# Altium footprint library Stabiliser.PcbLib: 128 footprints (part 6 of 8)
Each footprint in its own frame and in the unit in brackets; x right, y up, seen from the top. Pads: shape width x height; smd on the part's side, far side on the other; paste and mask are expansions set on the pad; w line width, h text height; cw(c..) or ccw(c..) is an arc to the next point about the centre after c.
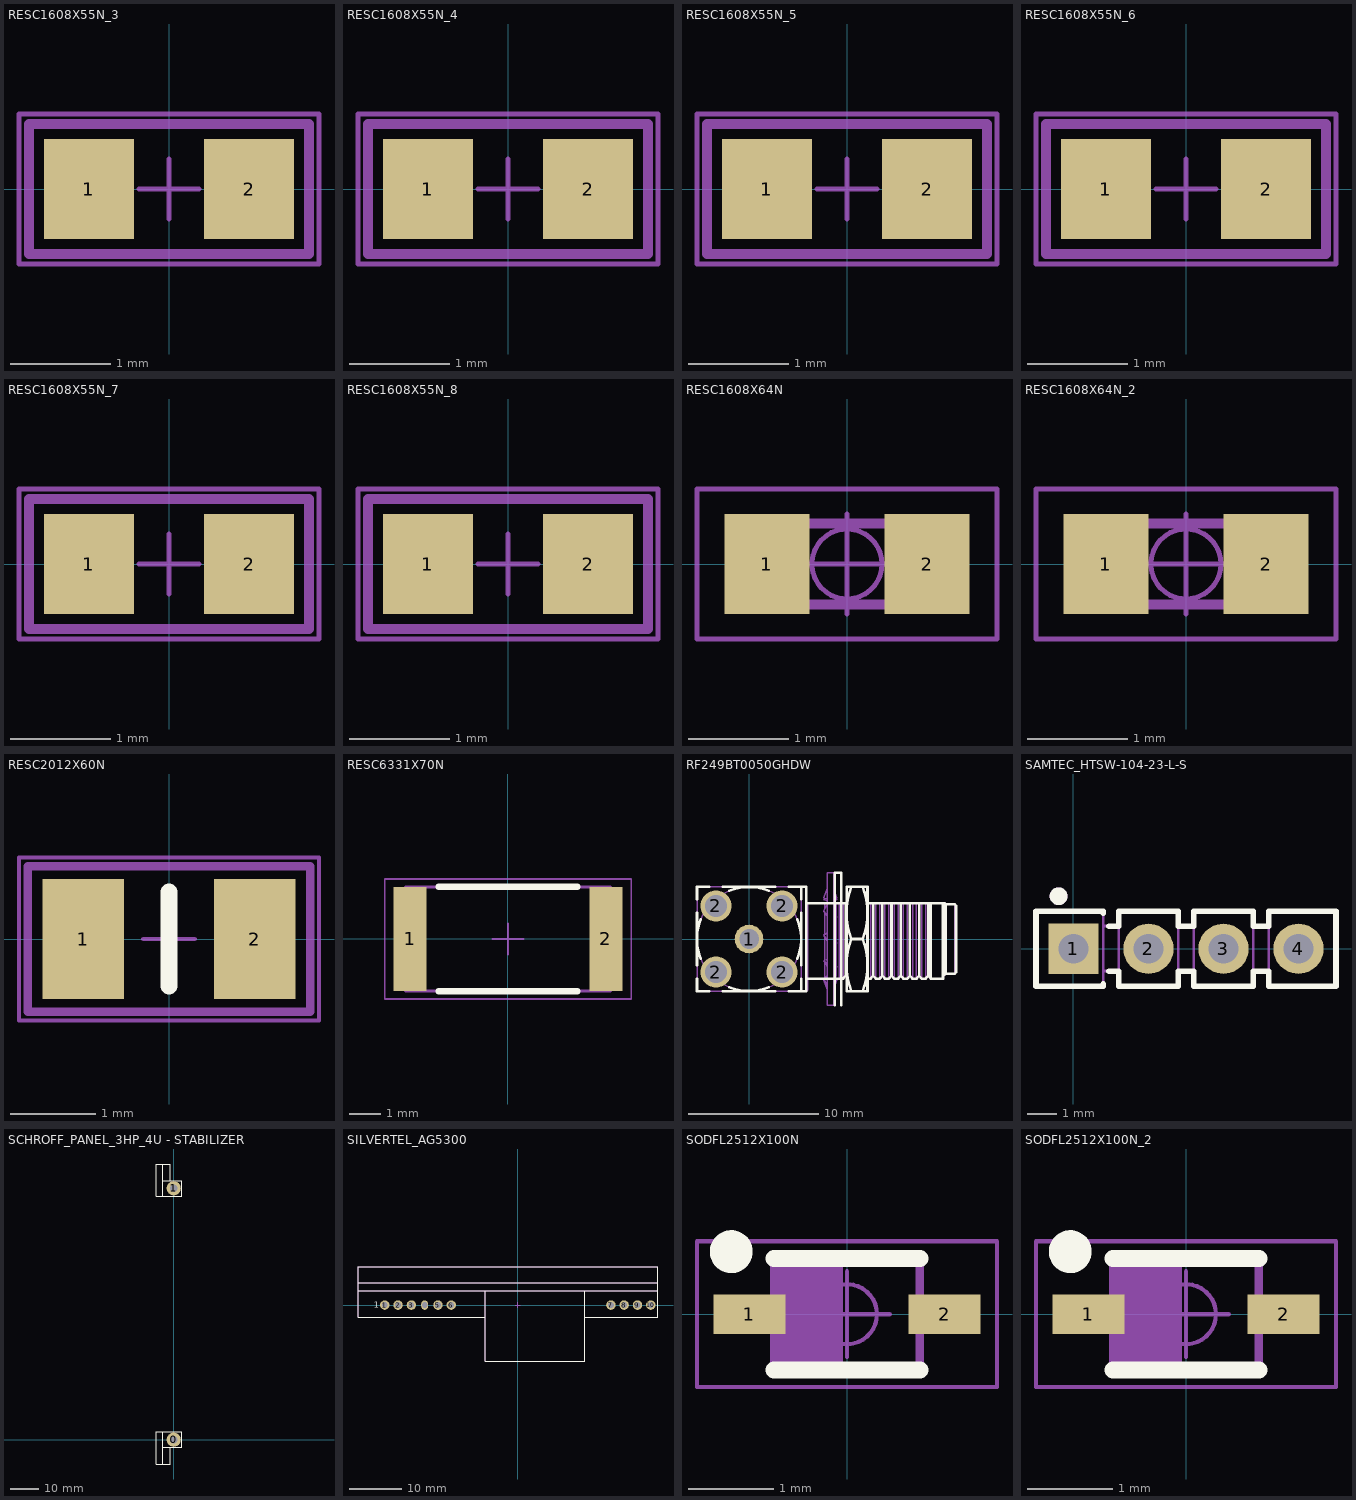
[diagram p5: the footprints below, top view; thin cyan lines are the x and y axes]

## RESC1608X55N_3 [mm]
pads (2):
  rect 0.9x1 smd: 1(-0.8,0) 2(0.8,0)
Mechanical 14:
  lines w0.1: -1.4,-0.65 -1.4,0.65 1.4,0.65 1.4,-0.65 -1.4,-0.65
Mechanical 15:
  lines w0.05: -0.3,0 0.3,0 ; 0,-0.3 0,0.3 ; -1.5,-0.75 1.5,-0.75 1.5,0.75 -1.5,0.75 -1.5,-0.75
3D body "RESC1608X55N.stp": height 0.55, standoff 0, extent -0.875,-0.475 0.875,0.475

## RESC1608X55N_4 [mm]
pads (2):
  rect 0.9x1 smd: 1(-0.8,0) 2(0.8,0)
Mechanical 14:
  lines w0.1: -1.4,-0.65 -1.4,0.65 1.4,0.65 1.4,-0.65 -1.4,-0.65
Mechanical 15:
  lines w0.05: -0.3,0 0.3,0 ; 0,-0.3 0,0.3 ; -1.5,-0.75 1.5,-0.75 1.5,0.75 -1.5,0.75 -1.5,-0.75
3D body "RESC1608X55N.stp": height 0.55, standoff 0, extent -0.875,-0.475 0.875,0.475

## RESC1608X55N_5 [mm]
pads (2):
  rect 0.9x1 smd: 1(-0.8,0) 2(0.8,0)
Mechanical 14:
  lines w0.1: -1.4,-0.65 1.4,-0.65 1.4,0.65 -1.4,0.65 -1.4,-0.65
Mechanical 15:
  lines w0.05: -0.3,0 0.3,0 ; 0,-0.3 0,0.3 ; -1.5,-0.75 -1.5,0.75 1.5,0.75 1.5,-0.75 -1.5,-0.75
3D body "RESC1608X55N.stp": height 0.55, standoff 0, extent -0.875,-0.475 0.875,0.475

## RESC1608X55N_6 [mm]
pads (2):
  rect 0.9x1 smd: 1(-0.8,0) 2(0.8,0)
Mechanical 14:
  lines w0.1: -1.4,-0.65 1.4,-0.65 1.4,0.65 -1.4,0.65 -1.4,-0.65
Mechanical 15:
  lines w0.05: -0.3,0 0.3,0 ; 0,-0.3 0,0.3 ; -1.5,-0.75 -1.5,0.75 1.5,0.75 1.5,-0.75 -1.5,-0.75
3D body "RESC1608X55N.stp": height 0.55, standoff 0, extent -0.875,-0.475 0.875,0.475

## RESC1608X55N_7 [mm]
pads (2):
  rect 0.9x1 smd: 1(-0.8,0) 2(0.8,0)
Mechanical 14:
  lines w0.1: -1.4,-0.65 1.4,-0.65 1.4,0.65 -1.4,0.65 -1.4,-0.65
Mechanical 15:
  lines w0.05: -0.3,0 0.3,0 ; 0,-0.3 0,0.3 ; -1.5,-0.75 -1.5,0.75 1.5,0.75 1.5,-0.75 -1.5,-0.75
3D body "RESC1608X55N.stp": height 0.55, standoff 0, extent -0.875,-0.475 0.875,0.475

## RESC1608X55N_8 [mm]
pads (2):
  rect 0.9x1 smd: 1(-0.8,0) 2(0.8,0)
Mechanical 14:
  lines w0.1: -1.4,-0.65 -1.4,0.65 1.4,0.65 1.4,-0.65 -1.4,-0.65
Mechanical 15:
  lines w0.05: -0.3,0 0.3,0 ; 0,-0.3 0,0.3 ; -1.5,-0.75 1.5,-0.75 1.5,0.75 -1.5,0.75 -1.5,-0.75
3D body "RESC1608X55N.stp": height 0.55, standoff 0, extent -0.875,-0.475 0.875,0.475

## RESC1608X64N [mm] "Chip Resistor, EIA 0603, Metric 1608, Body 1.6x0.8mm, IPC Medium Density"
height 0.64
pads (2):
  rect 0.85x1 smd: 1(-0.8,0) 2(0.8,0)
Mechanical 14:
  lines w0.1: -0.8,-0.405 -0.8,0.405 0.8,0.405 0.8,-0.405 -0.8,-0.405
Mechanical 15:
  circle w0.05: c0,0 r0.35
  lines w0.05: -0.5,0 0.5,0 ; 0,-0.5 0,0.5 ; -1.5,-0.75 -1.5,0.75 1.5,0.75 1.5,-0.75 -1.5,-0.75
3D body "RESC1608X64N.stp": height 0.64, standoff 0, extent -0.875,-0.475 0.875,0.475

## RESC1608X64N_2 [mm]
pads (2):
  rect 0.85x1 smd: 1(-0.8,0) 2(0.8,0)
Mechanical 14:
  lines w0.1: -0.8,-0.405 -0.8,0.405 0.8,0.405 0.8,-0.405 -0.8,-0.405
Mechanical 15:
  circle w0.05: c0,0 r0.35
  lines w0.05: -0.5,0 0.5,0 ; 0,-0.5 0,0.5 ; -1.5,-0.75 -1.5,0.75 1.5,0.75 1.5,-0.75 -1.5,-0.75
3D body "RESC1608X64N.stp": height 0.64, standoff 0, extent -0.875,-0.475 0.875,0.475

## RESC2012X60N [mm] "Chip Resistor, EIA 0805, Metric 2012, Body 2.0x1.2mm, IPC Medium Density"
height 0.6
pads (2):
  rect 0.95x1.4 smd: 1(-1,0) 2(1,0)
Top Overlay:
  lines w0.2: 0,-0.55 0,0.55
Mechanical 14:
  lines w0.1: -1.65,-0.85 1.65,-0.85 1.65,0.85 -1.65,0.85 -1.65,-0.85
Mechanical 15:
  lines w0.05: -0.3,0 0.3,0 ; 0,-0.3 0,0.3 ; -1.75,-0.95 -1.75,0.95 1.75,0.95 1.75,-0.95 -1.75,-0.95
3D body "RESC2012X60N.stp": height 0.6, standoff 0, extent -1.1,-0.675 1.1,0.675

## RESC6331X70N [mm] "Chip Resistor, EIA 2512, Metric 6331, 2-Leads, Body 6.3x3.1mm, IPC Medium Density"
height 0.7
pads (2):
  rect 1.05x3.3 smd: 1(-3.1,0) 2(3.1,0)
Top Overlay:
  lines w0.2: -2.2,-1.65 2.2,-1.65 ; -2.2,1.65 2.2,1.65
Mechanical 14:
  lines w0.1: -3.25,-1.65 3.25,-1.65 3.25,1.65 -3.25,1.65 -3.25,-1.65
Mechanical 15:
  lines w0.05: -0.5,0 0.5,0 ; 0,-0.5 0,0.5 ; -3.9,-1.9 3.9,-1.9 3.9,1.9 -3.9,1.9 -3.9,-1.9
3D body "RESC6331X70N.stp": height 0.7, standoff 0, extent -3.25,-1.65 3.25,1.65

## RF249BT0050GHDW [mm] "50 Ohm Through Hole SMA Right Angle PCB Jack"
height 10.44
pads (5):
  round 2.2 hole 1.5: 1(0,0)
  round 2.4 hole 1.7: 2(-2.54,-2.54) 2(-2.54,2.54) 2(2.54,-2.54) 2(2.54,2.54)
Top Overlay:
  lines w0.2: -4,-3.06 -4,-4 -3.06,-4 ; -4,-2.02 -4,2.02 ; -4,3.06 -4,4 -3.06,4 ; -3.702,-1.514 cw(c0,0) -3.702,1.514 ; -2.02,-4 2.02,-4 ; -2.02,4 2.02,4 ; -1.514,-3.702 ccw(c0,0) 1.514,-3.702 ; -1.514,3.702 cw(c0,0) 1.514,3.702 ; 3.06,-4 4.4,-4 4.4,2.75 ; 3.06,4 4.4,4 4.4,2.75 ; 3.702,-1.514 ccw(c0,0) 3.702,1.514 ; 4,-4 4,-3.06 ; 4,-2.02 4,2.02 ; 4,3.06 4,4 ; 4.5,-3.05 7.069,-3.05 ; 6.6,-5.1 6.6,5.1 7.1,5.1 7.1,-5.1 ; 6.917,-3.05 7.221,-3.05 7.422,-2.825 ; 7.422,2.75 7.422,-2.825 ; 7.5,-2.912 7.422,-2.825 ; 7.5,2.75 6,2.75 4.4,2.75 ; 7.857,-4 cw(c13.277,-2) 7.857,0 ; 7.857,4 ccw(c13.277,2) 7.857,0 ; 8.743,-4 ccw(c3.323,-2) 8.743,0 ; 8.743,4 cw(c3.323,2) 8.743,0 ; 9.1,-3.05 9.338,-3.05 9.539,-2.825 ; 9.1,2.75 15.021,2.75 15.1,2.675 15.1,-2.675 14.907,-2.858 ; 9.539,2.75 9.539,-2.825 ; 10.244,2.75 10.244,-2.825 ; 10.95,2.75 10.95,-2.825 ; 11.655,2.75 11.655,-2.825 ; 12.361,2.75 12.361,-2.825 ; 13.066,2.75 13.066,-2.825 ; 13.772,2.75 13.772,-2.825 ; 13.973,2.75 13.973,-3.05 ; 14.907,2.75 14.907,-3.05 13.973,-3.05 ; 15.1,-2.665 15.8,-2.665 15.9,-2.565 15.9,2.565 15.8,2.665 15.1,2.665 ; 7.857,0 8.743,0 ; 9.539,-2.825 9.739,-3.05 10.043,-3.05 10.244,-2.825 ; 10.244,-2.825 10.445,-3.05 10.749,-3.05 10.95,-2.825 ; 10.95,-2.825 11.151,-3.05 11.455,-3.05 11.655,-2.825 ; 11.655,-2.825 11.856,-3.05 12.16,-3.05 12.361,-2.825 ; 12.361,-2.825 12.562,-3.05 12.866,-3.05 13.066,-2.825 ; 13.066,-2.825 13.267,-3.05 13.571,-3.05 13.772,-2.825 ; 13.772,-2.825 13.973,-3.05 ; 7.5,-4 7.5,4 9.1,4 9.1,-4 7.5,-4
Mechanical 8:
  lines w0.05: -3.04,-2.54 -2.54,-2.54 ; -3.04,2.54 -2.54,2.54 ; -2.54,-3.04 -2.54,-2.54 ; -2.54,-2.04 -2.54,-2.54 ; -2.54,2.04 -2.54,2.54 ; -2.54,3.04 -2.54,2.54 ; -2.04,-2.54 -2.54,-2.54 ; -2.04,2.54 -2.54,2.54 ; -0.5,0 0,0 ; 0,-0.5 0,0 ; 0,0.5 0,0 ; 0.5,0 0,0 ; 2.04,-2.54 2.54,-2.54 ; 2.04,2.54 2.54,2.54 ; 2.54,-3.04 2.54,-2.54 ; 2.54,-2.04 2.54,-2.54 ; 2.54,2.04 2.54,2.54 ; 2.54,3.04 2.54,2.54 ; 3.04,-2.54 2.54,-2.54 ; 3.04,2.54 2.54,2.54
Mechanical 14:
  circle w0.1: c0,0 r4
  lines w0.1: 4,-4 4,4 ; 4.5,-3.05 5.907,-3.05 6,-2.957 ; 4.5,2.75 4.5,-3.9 4.4,-4 -4,-4 -4,4 4.4,4 4.4,2.75 6,2.75 ; 5.752,-3.001 6,-3.595 ; 5.81,-2.991 5.81,-1.747 ; 5.81,-1.649 5.81,0.189 ; 5.81,0.336 5.81,2.064 ; 5.81,2.277 5.81,2.75 ; 5.813,-3.148 5.752,-3.181 ; 5.813,3.148 5.752,3.001 ; 5.833,-3.195 5.752,-3.181 ; 5.873,-2.98 6,-2.837 ; 5.92,3.091 5.752,3.001 ; 6,-3.897 5.752,-3.181 ; 6,-2.206 ccw(c4.998,-2.351) 5.752,-1.676 ; 6,-1.92 5.752,-1.676 ; 6,-1.56 5.752,-1.676 ; 6,-0.139 5.752,0.29 6,0.488 ; 6,1.798 5.752,2.145 6,2.71 ; 6,2.957 5.752,3.001 ; 6,3.048 5.752,3.181 6,3.897 ; 6.5,-3.881 6.748,-3.181 6.5,-3.048 ; 6.5,-2.701 6.748,-2.145 6.5,-1.798 ; 6.5,-0.49 6.748,-0.29 6.5,0.139 ; 6.5,1.56 6.748,1.676 ; 6.5,1.909 6.748,1.676 ; 6.5,2.107 6.748,1.676 ; 6.5,2.75 7.5,2.75 ; 6.5,2.957 6.748,3.001 6.5,3.579 ; 6.5,3.881 6.748,3.181 ; 6.513,-3.055 6.716,-2.825 6.716,-2.215 ; 6.58,-3.091 6.748,-3.001 ; 6.586,-2.972 6.748,-3.001 ; 6.665,3.195 6.748,3.181 ; 6.685,-3.147 6.748,-3.001 ; 6.685,3.147 6.748,3.181 ; 6.716,-2.101 6.716,-0.315 ; 6.716,-0.236 6.716,1.661 ; 6.716,1.72 6.716,2.75 ; 6.917,2.75 6.917,-3.05 7.221,-3.05 ; 7.221,2.75 7.221,-3.05 ; 7.422,2.75 7.422,-2.825 ; 7.5,-2.912 7.422,-2.825 ; 7.857,-4 cw(c13.277,-2) 7.857,0 ; 7.857,4 ccw(c13.277,2) 7.857,0 ; 8.743,-4 ccw(c3.323,-2) 8.743,0 ; 8.743,4 cw(c3.323,2) 8.743,0 ; 9.1,-3.05 9.338,-3.05 ; 9.1,2.75 15.021,2.75 15.1,2.675 15.1,-2.675 14.907,-2.858 ; 9.338,2.75 9.338,-3.05 ; 9.539,2.75 9.539,-2.825 ; 9.739,2.75 9.739,-3.05 ; 10.044,2.75 10.043,-3.05 ; 10.244,2.75 10.244,-2.825 ; 10.445,2.75 10.445,-3.05 ; 10.749,2.75 10.749,-3.05 ; 10.95,2.75 10.95,-2.825 ; 11.151,2.75 11.151,-3.05 ; 11.455,2.75 11.455,-3.05 ; 11.655,2.75 11.655,-2.825 ; 11.856,2.75 11.856,-3.05 ; 12.16,2.75 12.16,-3.05 ; 12.361,2.75 12.361,-2.825 ; 12.562,2.75 12.562,-3.05 ; 12.866,2.75 12.866,-3.05 ; 13.066,2.75 13.066,-2.825 ; 13.267,2.75 13.267,-3.05 ; 13.571,2.75 13.571,-3.05 ; 13.772,2.75 13.772,-2.825 ; 13.973,2.75 13.973,-3.05 ; 14.907,2.75 14.907,-3.05 13.973,-3.05 ; 15.1,-2.665 15.8,-2.665 ; 15.1,2.665 15.8,2.665 ; 7.221,-3.05 7.422,-2.825 ; 7.857,0 8.743,0 ; 9.338,-3.05 9.539,-2.825 ; 9.539,-2.825 9.739,-3.05 ; 9.739,-3.05 10.043,-3.05 ; 10.043,-3.05 10.244,-2.825 ; 10.244,-2.825 10.445,-3.05 ; 10.445,-3.05 10.749,-3.05 ; 10.749,-3.05 10.95,-2.825 ; 10.95,-2.825 11.151,-3.05 ; 11.151,-3.05 11.455,-3.05 ; 11.455,-3.05 11.655,-2.825 ; 11.655,-2.825 11.856,-3.05 ; 11.856,-3.05 12.16,-3.05 ; 12.16,-3.05 12.361,-2.825 ; 12.361,-2.825 12.562,-3.05 ; 12.562,-3.05 12.866,-3.05 ; 12.866,-3.05 13.066,-2.825 ; 13.066,-2.825 13.267,-3.05 ; 13.267,-3.05 13.571,-3.05 ; 13.571,-3.05 13.772,-2.825 ; 13.772,-2.825 13.973,-3.05 ; 15.8,-2.665 15.8,2.665 ; 15.8,-2.665 15.9,-2.565 15.9,2.565 15.8,2.665 ; 6,-5.1 6,5.1 6.5,5.1 6.5,-5.1 6,-5.1 ; 7.5,-4 7.5,4 9.1,4 9.1,-4 7.5,-4
3D body "AMPHENOL_132203_2.stp": height 10.97, standoff 1.73, extent 8.1,-4 9.7,4
3D body "AMPHENOL_132203_1.stp": height 11.45, standoff 1.25, extent 6.352,-5.1 7.348,5.1
3D body "RF2-49B-T-00-50-G-HDW.stp": height 10.45, standoff -2.8, extent -3.5,-4 16.47,4

## SAMTEC_HTSW-104-23-L-S [mm] "4 Contacts - Pitch 2.54mm - Single Row  Through Mount Straigh Header (Post Lead 5.84mm, Tail Lead 2.92mm, Insulator 2.54mm)"
height 8.38
pads (4):
  rect 1.7x1.7 hole 1: 1(0,0)
  round 1.7 hole 1: 2(2.54,0) 3(5.08,0) 4(7.62,0)
Top Overlay:
  circle w0.3: c-0.508,1.778 r0.15
  lines w0.2: 1.007,-1.2 1.007,-1.27 -1.27,-1.27 -1.27,1.27 1.007,1.27 1.007,1.2 ; 1.2,-0.762 1.533,-0.762 1.533,-1.27 3.547,-1.27 3.547,-0.762 4.073,-0.762 4.073,-1.27 6.087,-1.27 6.087,-0.762 ; 1.2,0.762 1.533,0.762 1.533,1.27 3.547,1.27 3.547,0.762 4.073,0.762 4.073,1.27 6.087,1.27 6.087,0.762 ; 6.087,-0.762 6.613,-0.762 ; 6.087,-0.762 6.613,-0.762 ; 6.087,0.762 6.613,0.762 ; 6.087,0.762 6.613,0.762 ; 6.613,-0.762 6.613,-1.27 8.89,-1.27 8.89,1.27 6.613,1.27 6.613,0.762
Mechanical 8:
  lines w0.1: -0.5,0 0,0 ; 0,-0.5 0,0 ; 0,0.5 0,0 ; 0.5,0 0,0 ; 2.04,0 2.54,0 ; 2.54,-0.5 2.54,0 ; 2.54,0.5 2.54,0 ; 3.04,0 2.54,0 ; 4.58,0 5.08,0 ; 5.08,-0.5 5.08,0 ; 5.08,0.5 5.08,0 ; 5.58,0 5.08,0 ; 7.12,0 7.62,0 ; 7.62,-0.5 7.62,0 ; 7.62,0.5 7.62,0 ; 8.12,0 7.62,0
Mechanical 14:
  circle w0.3: c-0.508,1.778 r0.15
  lines w0.1: 1.007,-0.762 1.533,-0.762 ; 1.007,0.762 1.533,0.762 ; 3.547,-0.762 4.073,-0.762 ; 3.547,0.762 4.073,0.762 ; -1.27,-1.27 -1.27,1.27 1.007,1.27 1.007,-1.27 -1.27,-1.27 ; -0.317,-0.318 -0.318,0.317 0.317,0.317 0.318,-0.317 -0.317,-0.318 ; 1.533,-1.27 3.547,-1.27 3.547,1.27 1.533,1.27 1.533,-1.27 ; 2.223,-0.318 2.222,0.317 2.857,0.317 2.858,-0.317 2.223,-0.318 ; 4.073,-1.27 4.073,1.27 6.087,1.27 6.087,-1.27 4.073,-1.27 ; 4.763,-0.318 4.763,0.317 5.397,0.317 5.398,-0.317 4.763,-0.318 ; 6.087,-0.762 6.613,-0.762 6.087,-0.762 ; 6.087,0.762 6.613,0.762 6.087,0.762 ; 6.613,-1.27 6.613,1.27 8.89,1.27 8.89,-1.27 6.613,-1.27 ; 7.303,-0.318 7.303,0.317 7.938,0.317 7.938,-0.318 7.303,-0.318
3D body "SAMTEC_TSW-104-23-L-S.stp": height 8.38, standoff -2.92, extent -1.27,-1.27 8.89,1.27

## SCHROFF_PANEL_3HP_4U - STABILIZER [mm] "Schroff PCB 3HP 4U Eurocard Panel Kit"
pads (2):
  round 5 hole 2.7: 0(0,0) 1(0,88.9)
Top Overlay:
  lines w0.254: -4.826,-8.6 -6.1,-8.6 ; -4.826,97.5 -6.1,97.5 ; -3.8,-8.6 -3.8,2.75 2.75,2.75 2.75,-2.75 -3.8,-2.75 ; -3.8,91.65 2.75,91.65 2.75,86.15 -3.8,86.15 -3.8,97.5 ; -3.302,2.75 -6.1,2.75 -6.1,-8.6 ; -3.302,86.15 -6.1,86.15 -6.1,97.5 ; -1.21,-2.75 -1.21,-8.6 -6.1,-8.6 ; -1.21,91.65 -1.21,97.5 -6.1,97.5
3D body "Stabilizer_Panel1.stp": height 16.94, standoff -4.01, extent -22.6,-19.75 3,108.65

## SILVERTEL_AG5300 [mm] "Power-over-Ethernet Plus (POE+) Module, Body L 57.3mm x W 18mm x H 14mm"
height 14
pads (10):
  round 1.8 hole 1.1: 1(-25.406,0) 2(-22.866,0) 3(-20.326,0) 5(-15.246,0) 6(-12.706,0) 7(17.786,0) 8(20.326,0) 9(22.866,0) 10(25.406,0)
  oval 1.3x1.8 hole 1.1: 4(-17.786,0)
Top Overlay:
  lines w0.2: -30.516,2.7 26.784,2.7 ; -30.516,4.3 26.784,4.3 ; -6.216,-2.3 -30.516,-2.3 -30.516,7.3 26.784,7.3 26.784,-2.3 12.784,-2.3 ; -6.216,2.7 -6.216,-10.7 12.784,-10.7 12.784,2.7
  text "1" at -27.52,-0.55 h1.2
Mechanical 8:
  lines w0.1: -25.906,0 -25.406,0 ; -25.406,-0.5 -25.406,0 ; -25.406,0.5 -25.406,0 ; -24.906,0 -25.406,0 ; -23.366,0 -22.866,0 ; -22.866,-0.5 -22.866,0 ; -22.866,0.5 -22.866,0 ; -22.366,0 -22.866,0 ; -20.826,0 -20.326,0 ; -20.326,-0.5 -20.326,0 ; -20.326,0.5 -20.326,0 ; -19.826,0 -20.326,0 ; -18.286,0 -17.786,0 ; -17.786,-0.5 -17.786,0 ; -17.786,0.5 -17.786,0 ; -17.286,0 -17.786,0 ; -15.746,0 -15.246,0 ; -15.246,-0.5 -15.246,0 ; -15.246,0.5 -15.246,0 ; -14.746,0 -15.246,0 ; -13.206,0 -12.706,0 ; -12.706,-0.5 -12.706,0 ; -12.706,0.5 -12.706,0 ; -12.206,0 -12.706,0 ; -0.5,0 0,0 ; 0,-0.5 0,0 ; 0,0.5 0,0 ; 0.5,0 0,0 ; 17.286,0 17.786,0 ; 17.786,-0.5 17.786,0 ; 17.786,0.5 17.786,0 ; 18.286,0 17.786,0 ; 19.826,0 20.326,0 ; 20.326,-0.5 20.326,0 ; 20.326,0.5 20.326,0 ; 20.826,0 20.326,0 ; 22.366,0 22.866,0 ; 22.866,-0.5 22.866,0 ; 22.866,0.5 22.866,0 ; 23.366,0 22.866,0 ; 24.906,0 25.406,0 ; 25.406,-0.5 25.406,0 ; 25.406,0.5 25.406,0 ; 25.906,0 25.406,0
Mechanical 14:
  lines w0.1: -30.516,2.7 26.784,2.7 ; -30.516,4.3 26.784,4.3 ; -6.216,-2.3 -30.516,-2.3 -30.516,7.3 26.784,7.3 26.784,-2.3 12.784,-2.3 ; -6.216,2.7 -6.216,-10.7 12.784,-10.7 12.784,2.7
  text "1" at -27.52,-0.55 h1.2
3D body "SILVERTEL_AG5300.stp": height 14, standoff -3, extent -30.516,-10.7 26.784,7.3

## SODFL2512X100N [mm] "SODFL Diode; 1.70mm W X 1.25mm L X 1.00mm H body, IPC Medium Density"
height 1
pads (2):
  rect 0.84x0.46 smd: 1(-1.14,0) 2(1.14,0)
Top Overlay:
  circle w0.25: c-1.35,0.73 r0.125
  lines w0.2: -0.85,-0.65 0.85,-0.65 ; -0.85,0.65 0.85,0.65
Mechanical 14:
  region: -0.85,-0.625 -0.05,-0.625 -0.05,0.625 -0.85,0.625
  lines w0.1: -0.85,-0.625 0.85,-0.625 0.85,0.625 -0.85,0.625 -0.85,-0.625
Mechanical 15:
  circle w0.05: c0,0 r0.35
  lines w0.05: -0.5,0 0.5,0 ; 0,-0.5 0,0.5 ; -1.75,-0.85 1.75,-0.85 1.75,0.85 -1.75,0.85 -1.75,-0.85
3D body "SODFL2512X100N.stp": height 1, standoff 0, extent -1.35,-0.65 1.35,0.65

## SODFL2512X100N_2 [mm]
pads (2):
  rect 0.84x0.46 smd: 1(-1.14,0) 2(1.14,0)
Top Overlay:
  circle w0.25: c-1.35,0.73 r0.125
  lines w0.2: -0.85,-0.65 0.85,-0.65 ; -0.85,0.65 0.85,0.65
Mechanical 14:
  region: -0.85,-0.625 -0.05,-0.625 -0.05,0.625 -0.85,0.625
  lines w0.1: -0.85,-0.625 0.85,-0.625 0.85,0.625 -0.85,0.625 -0.85,-0.625
Mechanical 15:
  circle w0.05: c0,0 r0.35
  lines w0.05: -0.5,0 0.5,0 ; 0,-0.5 0,0.5 ; -1.75,-0.85 1.75,-0.85 1.75,0.85 -1.75,0.85 -1.75,-0.85
3D body "SODFL2512X100N.stp": height 1, standoff 0, extent -1.35,-0.65 1.35,0.65